# Altium footprint library SAMTEC SMD.PcbLib: 165 footprints (part 16 of 17)
Each footprint in its own frame and in the unit in brackets; x right, y up, seen from the top. Pads: shape width x height; smd on the part's side, far side on the other; paste and mask are expansions set on the pad; w line width, h text height; cw(c..) or ccw(c..) is an arc to the next point about the centre after c.
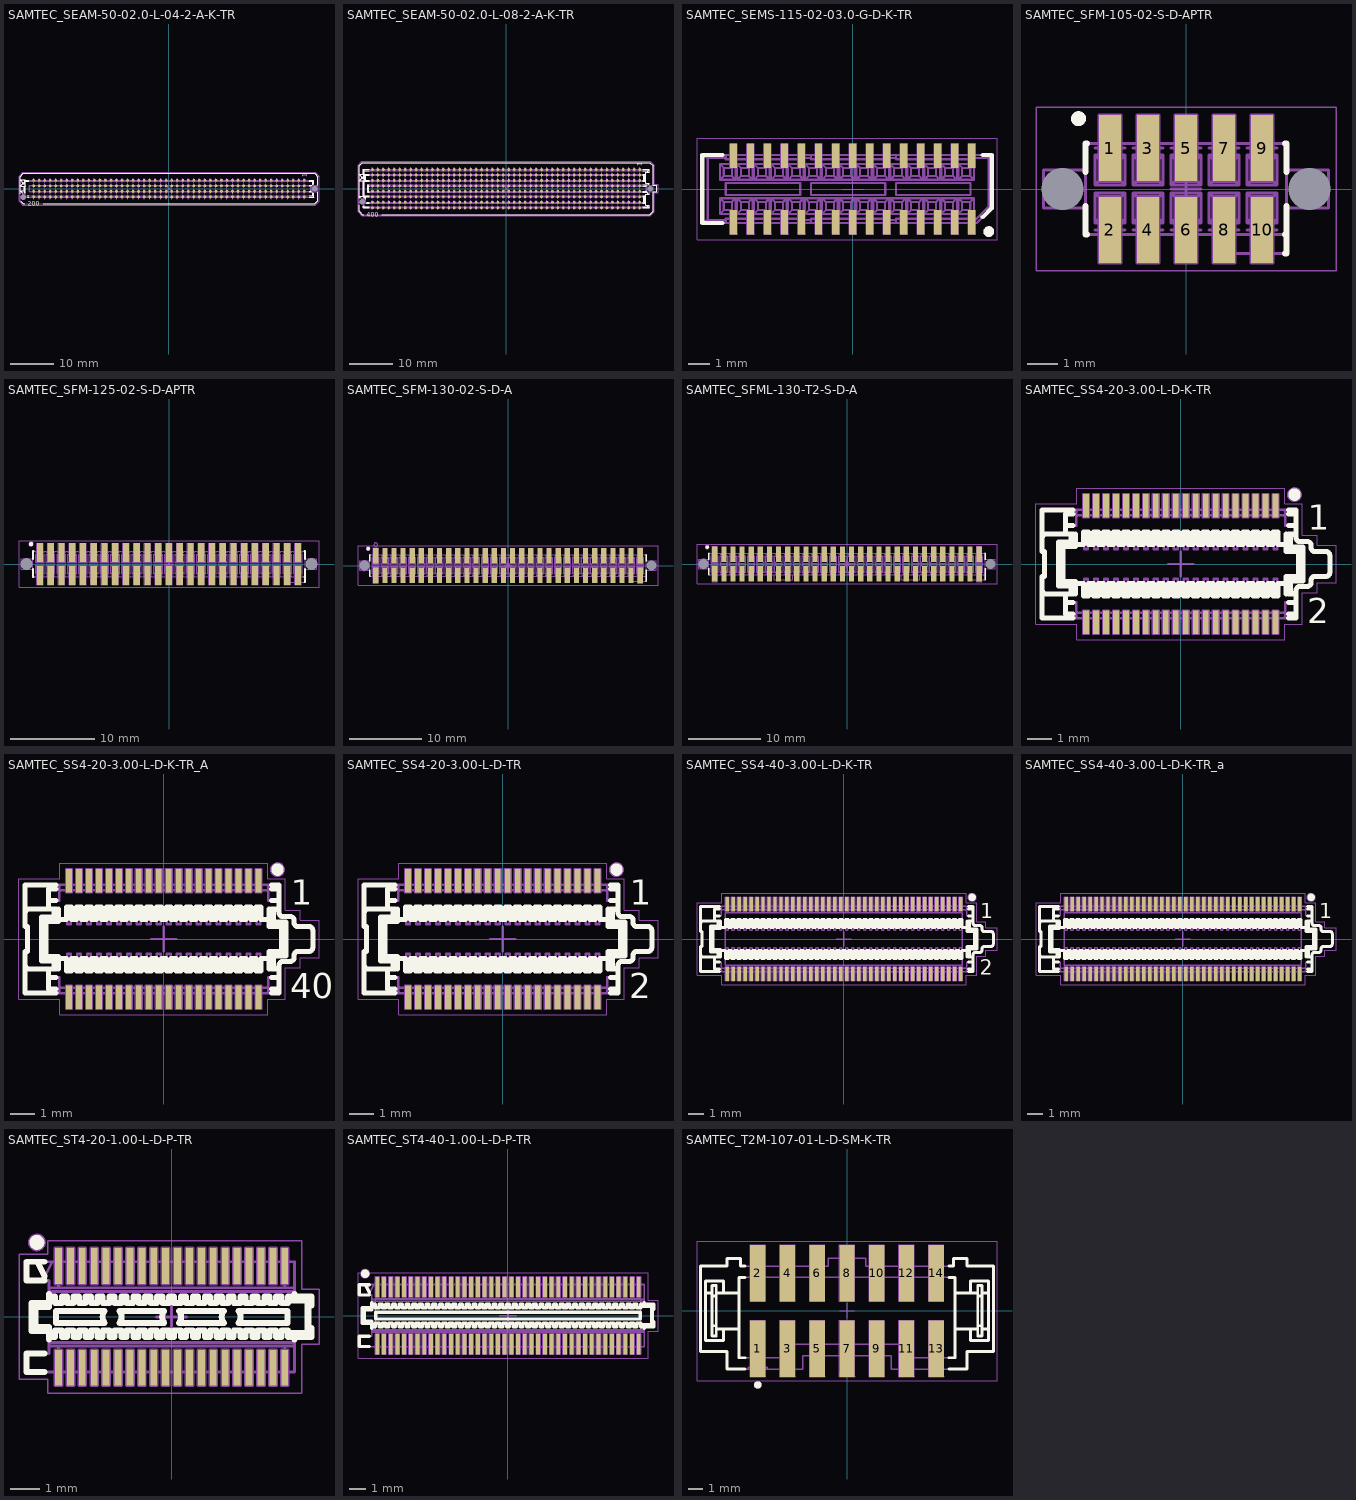
[diagram p15: the footprints below, top view; thin cyan lines are the x and y axes]

## SAMTEC_SEAM-50-02.0-L-04-2-A-K-TR [mm] "4 Rows x 50 Columns, 200 Contacts Male Connector"
height 5.72
pads (202):
  round 0.64 smd paste+0.125: 1(31.115,1.905) 2(31.115,0.635) 3(31.115,-0.635) 4(31.115,-1.905) 5(29.845,1.905) 6(29.845,0.635) 7(29.845,-0.635) 8(29.845,-1.905) 9(28.575,1.905) 10(28.575,0.635) 11(28.575,-0.635) 12(28.575,-1.905) 13(27.305,1.905) 14(27.305,0.635) 15(27.305,-0.635) 16(27.305,-1.905) 17(26.035,1.905) 18(26.035,0.635) 19(26.035,-0.635) 20(26.035,-1.905) 21(24.765,1.905) 22(24.765,0.635) 23(24.765,-0.635) 24(24.765,-1.905) 25(23.495,1.905) 26(23.495,0.635) 27(23.495,-0.635) 28(23.495,-1.905) 29(22.225,1.905) 30(22.225,0.635) 31(22.225,-0.635) 32(22.225,-1.905) 33(20.955,1.905) 34(20.955,0.635) 35(20.955,-0.635) 36(20.955,-1.905) 37(19.685,1.905) 38(19.685,0.635) 39(19.685,-0.635) 40(19.685,-1.905) 41(18.415,1.905) 42(18.415,0.635) 43(18.415,-0.635) 44(18.415,-1.905) 45(17.145,1.905) 46(17.145,0.635) 47(17.145,-0.635) 48(17.145,-1.905) 49(15.875,1.905) 50(15.875,0.635) 51(15.875,-0.635) 52(15.875,-1.905) 53(14.605,1.905) 54(14.605,0.635) 55(14.605,-0.635) 56(14.605,-1.905) 57(13.335,1.905) 58(13.335,0.635) 59(13.335,-0.635) 60(13.335,-1.905) 61(12.065,1.905) 62(12.065,0.635) 63(12.065,-0.635) 64(12.065,-1.905) 65(10.795,1.905) 66(10.795,0.635) 67(10.795,-0.635) 68(10.795,-1.905) 69(9.525,1.905) 70(9.525,0.635) 71(9.525,-0.635) 72(9.525,-1.905) 73(8.255,1.905) 74(8.255,0.635) 75(8.255,-0.635) 76(8.255,-1.905) 77(6.985,1.905) 78(6.985,0.635) 79(6.985,-0.635) 80(6.985,-1.905) 81(5.715,1.905) 82(5.715,0.635) 83(5.715,-0.635) 84(5.715,-1.905) 85(4.445,1.905) 86(4.445,0.635) 87(4.445,-0.635) 88(4.445,-1.905) 89(3.175,1.905) 90(3.175,0.635) 91(3.175,-0.635) 92(3.175,-1.905) 93(1.905,1.905) 94(1.905,0.635) 95(1.905,-0.635) 96(1.905,-1.905) 97(0.635,1.905) 98(0.635,0.635) 99(0.635,-0.635) 100(0.635,-1.905) 101(-0.635,1.905) 102(-0.635,0.635) 103(-0.635,-0.635) 104(-0.635,-1.905) 105(-1.905,1.905) 106(-1.905,0.635) 107(-1.905,-0.635) 108(-1.905,-1.905) 109(-3.175,1.905) 110(-3.175,0.635) 111(-3.175,-0.635) 112(-3.175,-1.905) 113(-4.445,1.905) 114(-4.445,0.635) 115(-4.445,-0.635) 116(-4.445,-1.905) 117(-5.715,1.905) 118(-5.715,0.635) 119(-5.715,-0.635) 120(-5.715,-1.905) 121(-6.985,1.905) 122(-6.985,0.635) 123(-6.985,-0.635) 124(-6.985,-1.905) 125(-8.255,1.905) 126(-8.255,0.635) 127(-8.255,-0.635) 128(-8.255,-1.905) 129(-9.525,1.905) 130(-9.525,0.635) 131(-9.525,-0.635) 132(-9.525,-1.905) 133(-10.795,1.905) 134(-10.795,0.635) 135(-10.795,-0.635) 136(-10.795,-1.905) 137(-12.065,1.905) 138(-12.065,0.635) 139(-12.065,-0.635) 140(-12.065,-1.905) 141(-13.335,1.905) 142(-13.335,0.635) 143(-13.335,-0.635) 144(-13.335,-1.905) 145(-14.605,1.905) 146(-14.605,0.635) 147(-14.605,-0.635) 148(-14.605,-1.905) 149(-15.875,1.905) 150(-15.875,0.635) 151(-15.875,-0.635) 152(-15.875,-1.905) 153(-17.145,1.905) 154(-17.145,0.635) 155(-17.145,-0.635) 156(-17.145,-1.905) 157(-18.415,1.905) 158(-18.415,0.635) 159(-18.415,-0.635) 160(-18.415,-1.905) 161(-19.685,1.905) 162(-19.685,0.635) 163(-19.685,-0.635) 164(-19.685,-1.905) 165(-20.955,1.905) 166(-20.955,0.635) 167(-20.955,-0.635) 168(-20.955,-1.905) 169(-22.225,1.905) 170(-22.225,0.635) 171(-22.225,-0.635) 172(-22.225,-1.905) 173(-23.495,1.905) 174(-23.495,0.635) 175(-23.495,-0.635) 176(-23.495,-1.905) 177(-24.765,1.905) 178(-24.765,0.635) 179(-24.765,-0.635) 180(-24.765,-1.905) 181(-26.035,1.905) 182(-26.035,0.635) 183(-26.035,-0.635) 184(-26.035,-1.905) 185(-27.305,1.905) 186(-27.305,0.635) 187(-27.305,-0.635) 188(-27.305,-1.905) 189(-28.575,1.905) 190(-28.575,0.635) 191(-28.575,-0.635) 192(-28.575,-1.905) 193(-29.845,1.905) 194(-29.845,0.635) 195(-29.845,-0.635) 196(-29.845,-1.905) 197(-31.115,1.905) 198(-31.115,0.635) 199(-31.115,-0.635) 200(-31.115,-1.905)
  round 0.5 hole 1.3 unplated mask+0.4: MEC1(-33.54,-2.01) MEC2(33.54,0)
Top Overlay:
  lines w0.2: -34.239,-1.227 -34.239,2.769 -33.477,3.531 33.477,3.531 34.239,2.769 34.239,0.783 ; -34.128,-2.88 -33.477,-3.531 -33.151,-3.531 ; -33.763,-0.984 -34.239,-0.508 -33.045,-0.508 ; -33.299,-0.508 -33.299,0.508 ; -33.251,-1.001 -33.082,-0.508 ; -33.082,0.508 -33.299,1.143 ; -33.082,2.032 -33.299,1.397 ; -33.045,-1.084 -33.045,-0.508 ; -33.045,1.676 -32.19,1.676 ; -33.045,1.93 -32.19,1.93 ; -32.544,-1.676 -32.19,-1.676 ; -32.493,-1.93 -32.19,-1.93 ; -28.9,-3.531 33.477,-3.531 34.239,-2.769 34.239,-0.783 ; 32.19,-1.93 33.299,-1.93 ; 32.19,-1.676 33.045,-1.676 ; 32.19,-0.737 32.766,-0.737 32.766,-0.71 ; 32.19,-0.61 32.639,-0.61 32.639,-0.539 ; 32.19,0.61 32.639,0.61 ; 32.19,0.737 32.766,0.737 ; 32.19,1.676 33.045,1.676 ; 32.19,1.93 33.299,1.93 ; 32.639,0.539 32.639,0.61 ; 32.766,0.71 32.766,0.737 ; 33.045,-0.926 33.045,-1.676 ; 33.045,0.926 33.045,1.676 ; 33.299,-1.022 33.299,-1.93 ; 33.299,1.022 33.299,1.93 ; -33.604,1.143 -34.239,0.508 -33.045,0.508 ; -33.604,1.143 -33.299,1.143 ; -33.604,1.143 -33.604,1.397 ; -33.604,1.397 -33.299,1.397 ; -33.604,1.397 -34.239,2.032 -33.045,2.032 -33.045,0.508 ; -33.299,1.143 -33.299,1.397 ; -33.045,-0.508 -33.045,0.508 ; 32.639,0.61 32.766,0.737 ; 33.045,-1.676 33.299,-1.93 ; 33.045,1.676 33.299,1.93
  text "200" at -32.426,-3.956 h1
  text "1" at 31.619,2.665 h1
Mechanical 8:
  drawing of 812 lines, arcs and shapes, not listed
Mechanical 14:
  lines w0.1: -33.299,-0.508 -33.299,0.508 ; -33.082,-2.032 -33.299,-1.397 ; -33.082,-0.508 -33.299,-1.143 ; -33.082,0.508 -33.299,1.143 ; -33.082,2.032 -33.299,1.397 ; -33.045,-1.93 33.299,-1.93 ; -33.045,-1.676 33.045,-1.676 ; -33.045,1.676 33.045,1.676 ; -33.045,1.93 33.299,1.93 ; 33.045,-0.762 34.239,-0.762 33.604,-0.127 ; 33.045,0.762 34.239,0.762 33.604,0.127 ; 33.082,-0.762 33.299,-0.127 ; 33.082,0.762 33.299,0.127 ; 33.299,-0.762 33.299,-1.93 ; 33.299,0.762 33.299,1.93 ; -33.604,-1.397 -34.239,-2.032 -33.045,-2.032 -33.045,-0.508 ; -33.604,-1.397 -33.299,-1.397 ; -33.604,-1.397 -33.604,-1.143 ; -33.604,-1.143 -34.239,-0.508 -33.045,-0.508 ; -33.604,-1.143 -33.299,-1.143 ; -33.604,1.143 -33.604,1.397 ; -33.604,1.143 -34.239,0.508 -33.045,0.508 ; -33.604,1.143 -33.299,1.143 ; -33.604,1.397 -33.299,1.397 ; -33.604,1.397 -34.239,2.032 -33.045,2.032 -33.045,0.508 ; -33.299,-1.397 -33.299,-1.143 ; -33.299,1.143 -33.299,1.397 ; -33.045,-0.508 -33.045,0.508 ; -32.131,-0.737 32.766,-0.737 32.766,0.737 ; -32.131,-0.737 -32.131,0.737 ; -32.131,-0.737 -32.004,-0.61 ; -32.131,0.737 32.766,0.737 ; -32.131,0.737 -32.004,0.61 ; -32.004,-0.61 -32.004,0.61 ; -32.004,-0.61 32.639,-0.61 32.639,0.61 ; -32.004,0.61 32.639,0.61 ; 32.639,0.61 32.766,0.737 ; 33.045,-1.676 33.299,-1.93 ; 33.045,-1.676 33.045,1.676 ; 33.045,1.676 33.299,1.93 ; 33.299,-0.127 33.604,-0.127 ; 33.299,-0.127 33.299,0.127 ; 33.299,0.127 33.604,0.127 ; 33.604,-0.127 33.604,0.127 ; -34.239,-2.769 -33.477,-3.531 33.477,-3.531 34.239,-2.769 34.239,2.769 33.477,3.531 -33.477,3.531 -34.239,2.769 -34.239,-2.769
  text "200" at -32.426,-3.956 h1
  text "1" at 31.619,2.665 h1
Mechanical 15:
  lines w0.05: -34.489,-2.872 -33.581,-3.781 33.581,-3.781 34.489,-2.872 34.489,2.872 33.581,3.781 -33.581,3.781 -34.489,2.872 -34.489,-2.872
3D body "SAMTEC_SEAM-50-02.0-L-04-2-A-K-TR.stp": height 5.61, standoff -1.27, extent -34.239,-3.53 34.239,3.531

## SAMTEC_SEAM-50-02.0-L-08-2-A-K-TR [mm] "8 rows x 50 Columns, 400 contacts Male Connector"
height 5.72
pads (402):
  round 0.64 smd paste+0.125: 1(31.115,4.445) 2(31.115,3.175) 3(31.115,1.905) 4(31.115,0.635) 5(31.115,-0.635) 6(31.115,-1.905) 7(31.115,-3.175) 8(31.115,-4.445) 9(29.845,4.445) 10(29.845,3.175) 11(29.845,1.905) 12(29.845,0.635) 13(29.845,-0.635) 14(29.845,-1.905) 15(29.845,-3.175) 16(29.845,-4.445) 17(28.575,4.445) 18(28.575,3.175) 19(28.575,1.905) 20(28.575,0.635) 21(28.575,-0.635) 22(28.575,-1.905) 23(28.575,-3.175) 24(28.575,-4.445) 25(27.305,4.445) 26(27.305,3.175) 27(27.305,1.905) 28(27.305,0.635) 29(27.305,-0.635) 30(27.305,-1.905) 31(27.305,-3.175) 32(27.305,-4.445) 33(26.035,4.445) 34(26.035,3.175) 35(26.035,1.905) 36(26.035,0.635) 37(26.035,-0.635) 38(26.035,-1.905) 39(26.035,-3.175) 40(26.035,-4.445) 41(24.765,4.445) 42(24.765,3.175) 43(24.765,1.905) 44(24.765,0.635) 45(24.765,-0.635) 46(24.765,-1.905) 47(24.765,-3.175) 48(24.765,-4.445) 49(23.495,4.445) 50(23.495,3.175) 51(23.495,1.905) 52(23.495,0.635) 53(23.495,-0.635) 54(23.495,-1.905) 55(23.495,-3.175) 56(23.495,-4.445) 57(22.225,4.445) 58(22.225,3.175) 59(22.225,1.905) 60(22.225,0.635) 61(22.225,-0.635) 62(22.225,-1.905) 63(22.225,-3.175) 64(22.225,-4.445) 65(20.955,4.445) 66(20.955,3.175) 67(20.955,1.905) 68(20.955,0.635) 69(20.955,-0.635) 70(20.955,-1.905) 71(20.955,-3.175) 72(20.955,-4.445) 73(19.685,4.445) 74(19.685,3.175) 75(19.685,1.905) 76(19.685,0.635) 77(19.685,-0.635) 78(19.685,-1.905) 79(19.685,-3.175) 80(19.685,-4.445) 81(18.415,4.445) 82(18.415,3.175) 83(18.415,1.905) 84(18.415,0.635) 85(18.415,-0.635) 86(18.415,-1.905) 87(18.415,-3.175) 88(18.415,-4.445) 89(17.145,4.445) 90(17.145,3.175) 91(17.145,1.905) 92(17.145,0.635) 93(17.145,-0.635) 94(17.145,-1.905) 95(17.145,-3.175) 96(17.145,-4.445) 97(15.875,4.445) 98(15.875,3.175) 99(15.875,1.905) 100(15.875,0.635) 101(15.875,-0.635) 102(15.875,-1.905) 103(15.875,-3.175) 104(15.875,-4.445) 105(14.605,4.445) 106(14.605,3.175) 107(14.605,1.905) 108(14.605,0.635) 109(14.605,-0.635) 110(14.605,-1.905) 111(14.605,-3.175) 112(14.605,-4.445) 113(13.335,4.445) 114(13.335,3.175) 115(13.335,1.905) 116(13.335,0.635) 117(13.335,-0.635) 118(13.335,-1.905) 119(13.335,-3.175) 120(13.335,-4.445) 121(12.065,4.445) 122(12.065,3.175) 123(12.065,1.905) 124(12.065,0.635) 125(12.065,-0.635) 126(12.065,-1.905) 127(12.065,-3.175) 128(12.065,-4.445) 129(10.795,4.445) 130(10.795,3.175) 131(10.795,1.905) 132(10.795,0.635) 133(10.795,-0.635) 134(10.795,-1.905) 135(10.795,-3.175) 136(10.795,-4.445) 137(9.525,4.445) 138(9.525,3.175) 139(9.525,1.905) 140(9.525,0.635) 141(9.525,-0.635) 142(9.525,-1.905) 143(9.525,-3.175) 144(9.525,-4.445) 145(8.255,4.445) 146(8.255,3.175) 147(8.255,1.905) 148(8.255,0.635) 149(8.255,-0.635) 150(8.255,-1.905) 151(8.255,-3.175) 152(8.255,-4.445) 153(6.985,4.445) 154(6.985,3.175) 155(6.985,1.905) 156(6.985,0.635) 157(6.985,-0.635) 158(6.985,-1.905) 159(6.985,-3.175) 160(6.985,-4.445) 161(5.715,4.445) 162(5.715,3.175) 163(5.715,1.905) 164(5.715,0.635) 165(5.715,-0.635) 166(5.715,-1.905) 167(5.715,-3.175) 168(5.715,-4.445) 169(4.445,4.445) 170(4.445,3.175) 171(4.445,1.905) 172(4.445,0.635) 173(4.445,-0.635) 174(4.445,-1.905) 175(4.445,-3.175) 176(4.445,-4.445) 177(3.175,4.445) 178(3.175,3.175) 179(3.175,1.905) 180(3.175,0.635) 181(3.175,-0.635) 182(3.175,-1.905) 183(3.175,-3.175) 184(3.175,-4.445) 185(1.905,4.445) 186(1.905,3.175) 187(1.905,1.905) 188(1.905,0.635) 189(1.905,-0.635) 190(1.905,-1.905) 191(1.905,-3.175) 192(1.905,-4.445) 193(0.635,4.445) 194(0.635,3.175) 195(0.635,1.905) 196(0.635,0.635) 197(0.635,-0.635) 198(0.635,-1.905) 199(0.635,-3.175) 200(0.635,-4.445) 201(-0.635,4.445) 202(-0.635,3.175) 203(-0.635,1.905) 204(-0.635,0.635) 205(-0.635,-0.635) 206(-0.635,-1.905) 207(-0.635,-3.175) 208(-0.635,-4.445) 209(-1.905,4.445) 210(-1.905,3.175) 211(-1.905,1.905) 212(-1.905,0.635) 213(-1.905,-0.635) 214(-1.905,-1.905) 215(-1.905,-3.175) 216(-1.905,-4.445) 217(-3.175,4.445) 218(-3.175,3.175) 219(-3.175,1.905) 220(-3.175,0.635) 221(-3.175,-0.635) 222(-3.175,-1.905) 223(-3.175,-3.175) 224(-3.175,-4.445) 225(-4.445,4.445) 226(-4.445,3.175) 227(-4.445,1.905) 228(-4.445,0.635) 229(-4.445,-0.635) 230(-4.445,-1.905) 231(-4.445,-3.175) 232(-4.445,-4.445) 233(-5.715,4.445) 234(-5.715,3.175) 235(-5.715,1.905) 236(-5.715,0.635) 237(-5.715,-0.635) 238(-5.715,-1.905) 239(-5.715,-3.175) 240(-5.715,-4.445) 241(-6.985,4.445) 242(-6.985,3.175) 243(-6.985,1.905) 244(-6.985,0.635) 245(-6.985,-0.635) 246(-6.985,-1.905) 247(-6.985,-3.175) 248(-6.985,-4.445) 249(-8.255,4.445) 250(-8.255,3.175) 251(-8.255,1.905) 252(-8.255,0.635) 253(-8.255,-0.635) 254(-8.255,-1.905) 255(-8.255,-3.175) 256(-8.255,-4.445) 257(-9.525,4.445) 258(-9.525,3.175) 259(-9.525,1.905) 260(-9.525,0.635) 261(-9.525,-0.635) 262(-9.525,-1.905) 263(-9.525,-3.175) 264(-9.525,-4.445) 265(-10.795,4.445) 266(-10.795,3.175) 267(-10.795,1.905) 268(-10.795,0.635) 269(-10.795,-0.635) 270(-10.795,-1.905) 271(-10.795,-3.175) 272(-10.795,-4.445) 273(-12.065,4.445) 274(-12.065,3.175) 275(-12.065,1.905) 276(-12.065,0.635) 277(-12.065,-0.635) 278(-12.065,-1.905) 279(-12.065,-3.175) 280(-12.065,-4.445) 281(-13.335,4.445) 282(-13.335,3.175) 283(-13.335,1.905) 284(-13.335,0.635) 285(-13.335,-0.635) 286(-13.335,-1.905) 287(-13.335,-3.175) 288(-13.335,-4.445) 289(-14.605,4.445) 290(-14.605,3.175) 291(-14.605,1.905) 292(-14.605,0.635) 293(-14.605,-0.635) 294(-14.605,-1.905) 295(-14.605,-3.175) 296(-14.605,-4.445) 297(-15.875,4.445) 298(-15.875,3.175) 299(-15.875,1.905) 300(-15.875,0.635) 301(-15.875,-0.635) 302(-15.875,-1.905) 303(-15.875,-3.175) 304(-15.875,-4.445) 305(-17.145,4.445) 306(-17.145,3.175) 307(-17.145,1.905) 308(-17.145,0.635) 309(-17.145,-0.635) 310(-17.145,-1.905) 311(-17.145,-3.175) 312(-17.145,-4.445) 313(-18.415,4.445) 314(-18.415,3.175) 315(-18.415,1.905) 316(-18.415,0.635) 317(-18.415,-0.635) 318(-18.415,-1.905) 319(-18.415,-3.175) 320(-18.415,-4.445) 321(-19.685,4.445) 322(-19.685,3.175) 323(-19.685,1.905) 324(-19.685,0.635) 325(-19.685,-0.635) 326(-19.685,-1.905) 327(-19.685,-3.175) 328(-19.685,-4.445) 329(-20.955,4.445) 330(-20.955,3.175) 331(-20.955,1.905) 332(-20.955,0.635) 333(-20.955,-0.635) 334(-20.955,-1.905) 335(-20.955,-3.175) 336(-20.955,-4.445) 337(-22.225,4.445) 338(-22.225,3.175) 339(-22.225,1.905) 340(-22.225,0.635) 341(-22.225,-0.635) 342(-22.225,-1.905) 343(-22.225,-3.175) 344(-22.225,-4.445) 345(-23.495,4.445) 346(-23.495,3.175) 347(-23.495,1.905) 348(-23.495,0.635) 349(-23.495,-0.635) 350(-23.495,-1.905) 351(-23.495,-3.175) 352(-23.495,-4.445) 353(-24.765,4.445) 354(-24.765,3.175) 355(-24.765,1.905) 356(-24.765,0.635) 357(-24.765,-0.635) 358(-24.765,-1.905) 359(-24.765,-3.175) 360(-24.765,-4.445) 361(-26.035,4.445) 362(-26.035,3.175) 363(-26.035,1.905) 364(-26.035,0.635) 365(-26.035,-0.635) 366(-26.035,-1.905) 367(-26.035,-3.175) 368(-26.035,-4.445) 369(-27.305,4.445) 370(-27.305,3.175) 371(-27.305,1.905) 372(-27.305,0.635) 373(-27.305,-0.635) 374(-27.305,-1.905) 375(-27.305,-3.175) 376(-27.305,-4.445) 377(-28.575,4.445) 378(-28.575,3.175) 379(-28.575,1.905) 380(-28.575,0.635) 381(-28.575,-0.635) 382(-28.575,-1.905) 383(-28.575,-3.175) 384(-28.575,-4.445) 385(-29.845,4.445) 386(-29.845,3.175) 387(-29.845,1.905) 388(-29.845,0.635) 389(-29.845,-0.635) 390(-29.845,-1.905) 391(-29.845,-3.175) 392(-29.845,-4.445) 393(-31.115,4.445) 394(-31.115,3.175) 395(-31.115,1.905) 396(-31.115,0.635) 397(-31.115,-0.635) 398(-31.115,-1.905) 399(-31.115,-3.175) 400(-31.115,-4.445)
  round 0.5 hole 1.3 unplated mask+0.4: MEC1(-33.54,-3.05) MEC2(33.54,0)
Top Overlay:
  lines w0.2: -34.239,-3.833 -34.239,-5.309 -33.477,-6.071 -33.151,-6.071 ; -33.939,-2.079 -34.239,-1.778 ; -33.299,-4.072 -33.299,-4.47 ; -33.299,-1.778 -33.299,1.778 ; -33.299,3.302 -33.299,4.47 ; -33.18,-2.064 -33.082,-1.778 ; -33.082,1.778 -33.299,2.413 ; -33.082,3.302 -33.299,2.667 ; -33.045,-3.976 -33.045,-4.216 ; -33.045,-2.124 -33.045,4.216 ; -33.045,-1.778 -34.239,-1.778 ; -33.045,1.778 -34.239,1.778 -33.604,2.413 ; -33.045,3.302 -34.239,3.302 -33.604,2.667 ; -32.893,-2.223 -32.893,-1.676 ; -32.639,-2.511 -32.639,-1.93 ; -32.551,-3.404 -31.835,-3.404 ; -32.495,-3.15 -31.835,-3.15 ; -31.835,-4.47 -33.299,-4.47 ; -31.835,-4.216 -33.045,-4.216 ; -31.835,-1.93 -32.639,-1.93 ; -31.835,-1.676 -32.893,-1.676 ; -31.835,-0.864 -32.258,-0.864 ; -31.835,-0.61 -32.004,-0.61 ; -31.835,0.61 -32.004,0.61 ; -31.835,0.864 -32.258,0.864 ; -31.835,1.676 -32.893,1.676 ; -31.835,1.93 -32.639,1.93 ; -31.835,3.15 -32.639,3.15 ; -31.835,3.404 -32.893,3.404 ; -31.835,4.216 -33.045,4.216 ; -31.835,4.47 -33.299,4.47 ; -28.9,-6.071 33.477,-6.071 34.239,-5.309 34.239,-0.783 ; 31.835,-4.47 33.3,-4.47 ; 31.835,-4.216 33.046,-4.216 ; 31.835,-3.404 32.258,-3.404 ; 31.835,-3.15 32.004,-3.15 ; 31.835,-1.93 32.004,-1.93 ; 31.835,-1.676 32.258,-1.676 ; 31.835,-0.864 32.792,-0.864 ; 31.835,-0.61 32.639,-0.61 ; 31.835,0.61 32.639,0.61 ; 31.835,0.864 32.792,0.864 ; 31.835,1.676 32.258,1.676 ; 31.835,1.93 32.004,1.93 ; 31.835,3.15 32.004,3.15 ; 31.835,3.404 32.258,3.404 ; 31.835,4.216 33.046,4.216 ; 31.835,4.47 33.3,4.47 ; 32.639,-0.539 32.639,-0.61 ; 32.639,0.539 32.639,0.61 ; 32.792,-0.736 32.792,-0.864 ; 32.792,0.736 32.792,0.864 ; 33.046,-3.835 33.046,-4.216 ; 33.046,-1.295 33.046,-0.926 ; 33.046,1.295 33.049,0.928 ; 33.046,3.835 33.046,4.216 ; 33.3,-1.022 33.3,-1.295 32.487,-1.295 32.487,-3.835 33.3,-3.835 33.3,-4.47 ; 33.3,1.022 33.3,1.295 32.487,1.295 32.487,3.835 33.3,3.835 33.3,4.47 ; 34.239,0.783 34.239,5.309 33.477,6.071 -33.477,6.071 -34.239,5.309 -34.239,-2.267 -34.239,-1.778 ; 34.263,-0.762 35.128,-0.762 35.128,0.762 34.263,0.762 ; -33.604,2.413 -33.299,2.413 ; -33.604,2.413 -33.604,2.667 ; -33.604,2.667 -33.299,2.667 ; -33.299,-4.47 -33.045,-4.216 ; -33.299,2.413 -33.299,2.667 ; -33.299,4.47 -33.045,4.216 ; -32.893,-1.676 -32.639,-1.93 ; -32.893,1.676 -32.893,3.404 ; -32.893,1.676 -32.639,1.93 ; -32.893,3.404 -32.639,3.15 ; -32.639,1.93 -32.639,3.15 ; -32.258,-0.864 -32.004,-0.61 ; -32.258,-0.864 -32.258,0.864 ; -32.258,0.864 -32.004,0.61 ; -32.004,-0.61 -32.004,0.61 ; 32.004,-3.15 32.004,-1.93 ; 32.004,-3.15 32.258,-3.404 ; 32.004,-1.93 32.258,-1.676 ; 32.004,1.93 32.258,1.676 ; 32.004,1.93 32.004,3.15 ; 32.004,3.15 32.258,3.404 ; 32.258,-3.404 32.258,-1.676 ; 32.258,1.676 32.258,3.404 ; 32.639,-0.61 32.792,-0.864 ; 32.639,0.61 32.792,0.864 ; 33.046,-4.216 33.3,-4.47 ; 33.046,4.216 33.3,4.47
  text "1" at 31.619,5.205 h1
  text "400" at -32.426,-6.496 h1
Mechanical 8:
  drawing of 1614 lines, arcs and shapes, not listed
Mechanical 14:
  lines w0.1: -33.299,-3.302 -33.299,-4.47 ; -33.299,-1.778 -33.299,1.778 ; -33.299,3.302 -33.299,4.47 ; -33.082,-3.302 -33.299,-2.667 ; -33.082,-1.778 -33.299,-2.413 ; -33.082,1.778 -33.299,2.413 ; -33.082,3.302 -33.299,2.667 ; -33.045,-3.302 -34.239,-3.302 ; -33.045,-1.778 -34.239,-1.778 ; -33.045,1.778 -34.239,1.778 -33.604,2.413 ; -33.045,3.302 -34.239,3.302 -33.604,2.667 ; 33.045,-3.835 33.045,-4.216 ; 33.045,-1.295 33.045,-0.762 ; 33.045,1.295 33.05,0.762 ; 33.045,3.835 33.045,4.216 ; 33.299,-0.762 33.299,-1.295 32.487,-1.295 32.487,-3.835 33.299,-3.835 33.299,-4.47 ; 33.299,0.762 33.299,1.295 32.487,1.295 32.487,3.835 33.299,3.835 33.299,4.47 ; -34.239,-3.302 -33.604,-2.667 ; -34.239,-3.302 -34.239,-1.778 ; -34.239,-1.778 -33.604,-2.413 ; -33.604,-2.667 -33.299,-2.667 ; -33.604,-2.667 -33.604,-2.413 ; -33.604,-2.413 -33.299,-2.413 ; -33.604,2.413 -33.604,2.667 ; -33.604,2.413 -33.299,2.413 ; -33.604,2.667 -33.299,2.667 ; -33.299,-4.47 -33.045,-4.216 ; -33.299,-4.47 33.299,-4.47 ; -33.299,-2.667 -33.299,-2.413 ; -33.299,2.413 -33.299,2.667 ; -33.299,4.47 33.299,4.47 ; -33.299,4.47 -33.045,4.216 ; -33.045,-4.216 33.045,-4.216 ; -33.045,-4.216 -33.045,4.216 ; -33.045,4.216 33.045,4.216 ; -32.893,-3.404 -32.893,-1.676 ; -32.893,-3.404 -32.639,-3.15 ; -32.893,-3.404 32.258,-3.404 ; -32.893,-1.676 -32.639,-1.93 ; -32.893,-1.676 32.258,-1.676 ; -32.893,1.676 -32.893,3.404 ; -32.893,1.676 32.258,1.676 ; -32.893,1.676 -32.639,1.93 ; -32.893,3.404 32.258,3.404 ; -32.893,3.404 -32.639,3.15 ; -32.639,-3.15 -32.639,-1.93 ; -32.639,-3.15 32.004,-3.15 ; -32.639,-1.93 32.004,-1.93 ; -32.639,1.93 -32.639,3.15 ; -32.639,1.93 32.004,1.93 ; -32.639,3.15 32.004,3.15 ; -32.258,-0.864 -32.258,0.864 ; -32.258,-0.864 -32.004,-0.61 ; -32.258,-0.864 32.791,-0.864 ; -32.258,0.864 -32.004,0.61 ; -32.258,0.864 32.791,0.864 ; -32.004,-0.61 -32.004,0.61 ; -32.004,-0.61 32.639,-0.61 ; -32.004,0.61 32.639,0.61 ; 32.004,-3.15 32.258,-3.404 ; 32.004,-3.15 32.004,-1.93 ; 32.004,-1.93 32.258,-1.676 ; 32.004,1.93 32.258,1.676 ; 32.004,1.93 32.004,3.15 ; 32.004,3.15 32.258,3.404 ; 32.258,-3.404 32.258,-1.676 ; 32.258,1.676 32.258,3.404 ; 32.639,-0.61 32.791,-0.864 ; 32.639,-0.61 32.639,0.61 ; 32.639,0.61 32.791,0.864 ; 32.791,-0.864 32.791,0.864 ; 33.045,-4.216 33.299,-4.47 ; 33.045,4.216 33.299,4.47 ; 34.239,-0.762 32.842,-0.762 32.842,0.762 34.239,0.762 ; 34.239,-0.762 34.239,0.762 ; 34.239,-0.762 34.239,-5.309 33.477,-6.071 -33.477,-6.071 -34.239,-5.309 -34.239,5.309 -33.477,6.071 33.477,6.071 34.239,5.309 34.239,0.762 ; 34.239,-0.762 35.128,-0.762 35.128,0.762 34.239,0.762
  text "1" at 31.619,5.205 h1
  text "1" at 31.619,5.205 h1
  text "400" at -32.426,-6.496 h1
Mechanical 15:
  lines w0.1: -34.489,-5.412 -34.489,5.412 -33.581,6.321 33.581,6.321 34.489,5.412 34.489,1.012 35.378,1.012 35.378,-1.012 34.489,-1.012 34.489,-5.412 33.581,-6.321 -33.581,-6.321 -34.489,-5.412
3D body "SAMTEC_SEAM-50-02.0-L-08-2-A-K-TR.stp": height 5.61, standoff -1.27, extent -34.239,-6.07 35.128,6.071

## SAMTEC_SEMS-115-02-03.0-G-D-K-TR [mm] "30 Contacts, Pitch 0.8mm, Dual Row Straigth Socket, Micro Tiger Eye Slim Strip"
height 3.36
pads (30):
  rect 0.34x1.14 smd: 1(5.6,-1.56) 2(5.6,1.56) 3(4.8,-1.56) 4(4.8,1.56) 5(4,-1.56) 6(4,1.56) 7(3.2,-1.56) 8(3.2,1.56) 9(2.4,-1.56) 10(2.4,1.56) 11(1.6,-1.56) 12(1.6,1.56) 13(0.8,-1.56) 14(0.8,1.56) 15(0,-1.56) 16(0,1.56) 17(-0.8,-1.56) 18(-0.8,1.56) 19(-1.6,-1.56) 20(-1.6,1.56) 21(-2.4,-1.56) 22(-2.4,1.56) 23(-3.2,-1.56) 24(-3.2,1.56) 25(-4,-1.56) 26(-4,1.56) 27(-4.8,-1.56) 28(-4.8,1.56) 29(-5.6,-1.56) 30(-5.6,1.56)
Top Overlay:
  circle w0.25: c6.4,-2 r0.125
  lines w0.2: -6.12,-1.6 -7.067,-1.6 -7.067,1.6 -6.12,1.6 ; 6.12,-1.314 6.534,-0.9 6.534,1.6 6.12,1.6
Mechanical 8:
  drawing of 184 lines, arcs and shapes, not listed
  text "1" at 5.5,-0.7 h0.5
  text "2" at 5.4,0.2 h0.5
  text "30" at -6,0.2 h0.5
  text "29" at -6,-0.7 h0.5
Mechanical 14:
  drawing of 411 lines, arcs and shapes, not listed
Mechanical 15:
  lines w0.05: -7.317,-2.38 -7.317,2.38 6.784,2.38 6.784,-2.38 -7.317,-2.38
3D body "SAMTEC_SEMS-115-02-03.0-G-D-K-TR.stp": height 3.36, standoff 0, extent -7.067,-1.875 6.534,1.875
